# Altium footprint library myPcbLib.PcbLib: 987 footprints (part 1 of 62)
Each footprint in its own frame and in the unit in brackets; x right, y up, seen from the top. Pads: shape width x height; smd on the part's side, far side on the other; paste and mask are expansions set on the pad; w line width, h text height; cw(c..) or ccw(c..) is an arc to the next point about the centre after c.
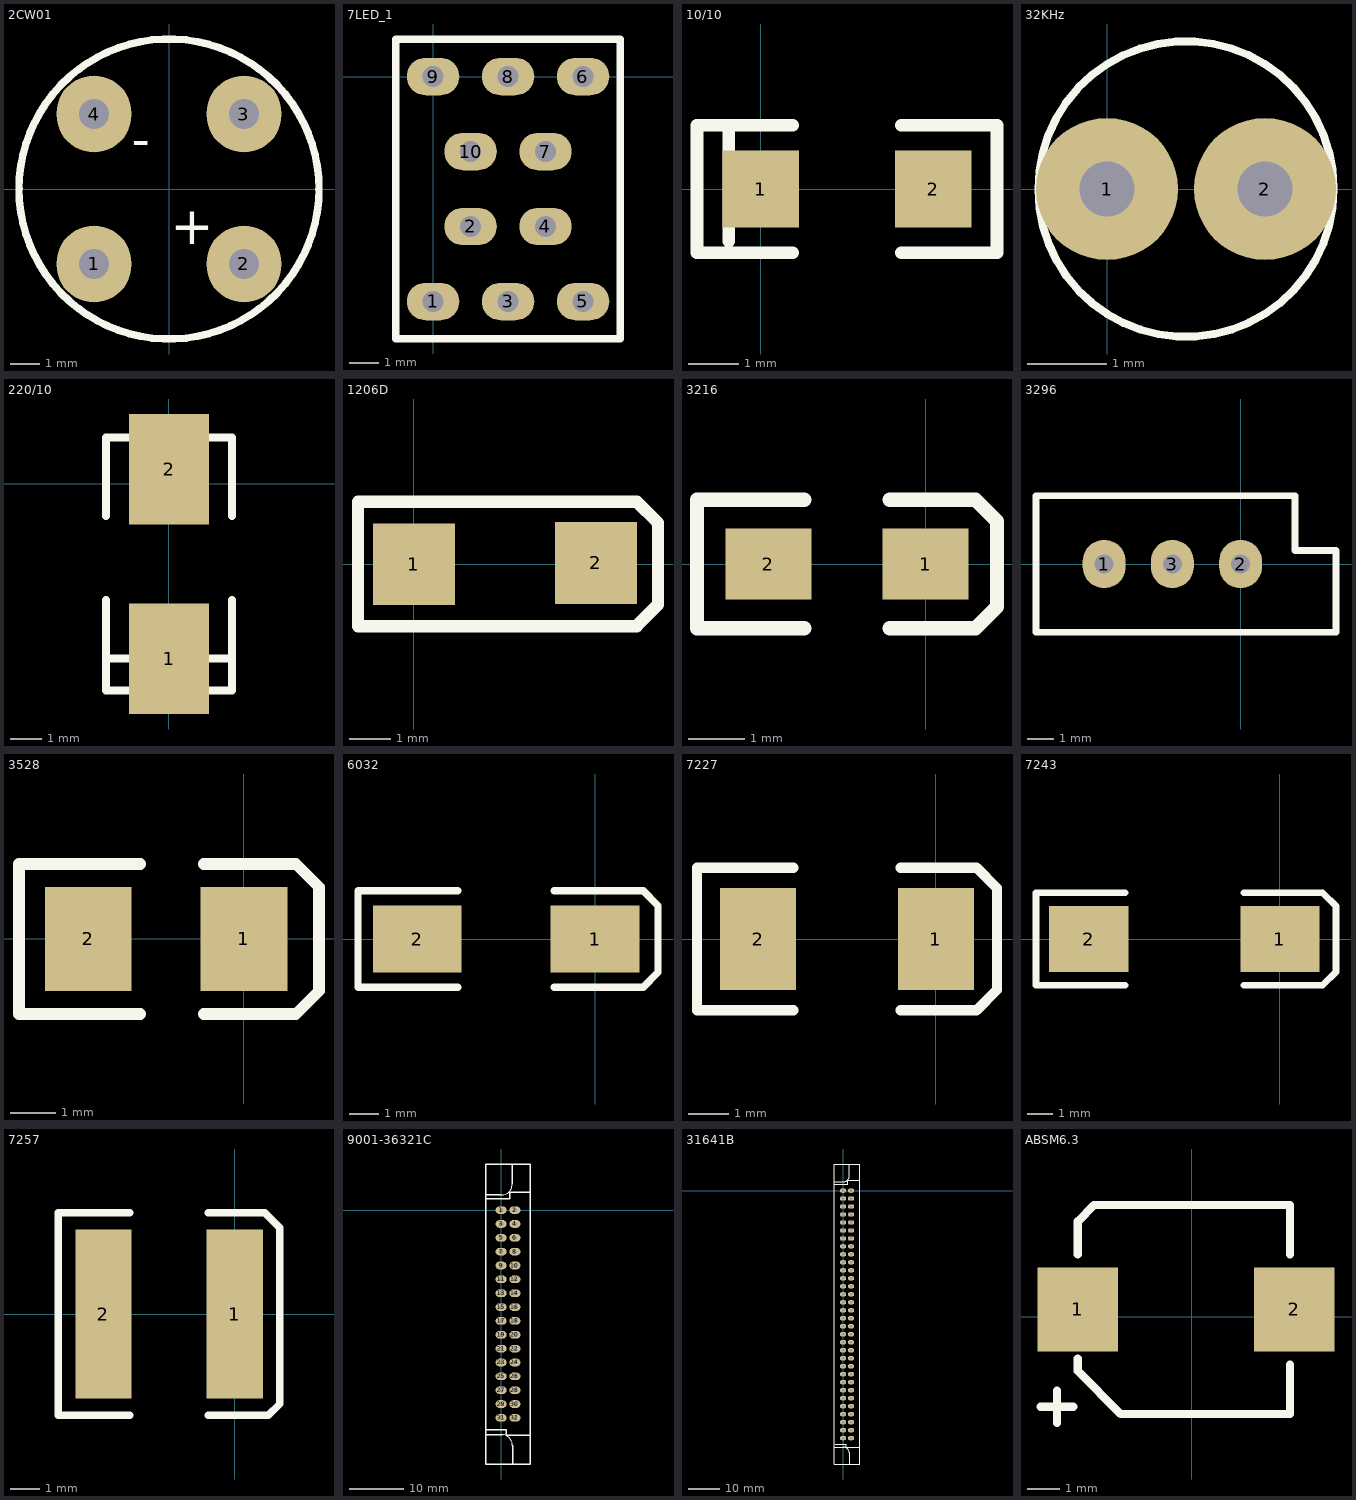
[diagram p0: the footprints below, top view; thin cyan lines are the x and y axes]

## 2CW01 [mm]
pads (4):
  oval 2.54x2.6 hole 1.016: 1(-2.54,-2.54) 2(2.54,-2.54) 3(2.54,2.54) 4(-2.54,2.54)
Top Overlay:
  circle w0.254: c0,0 r5.08
  text "+" at 1.524,-0.762 h1.27
  text "-" at -0.635,2.032 h1.27

## 7LED_1 [mil]
pads (10):
  oval 70x50 hole 28: 1(0,-300) 2(50,-200) 3(100,-300) 4(150,-200) 5(200,-300) 6(200,0) 7(150,-100) 8(100,0) 9(0,0) 10(50,-100)
Top Overlay:
  lines w10: -50,-350 -50,50 250,50 250,-350 -50,-350

## 10/10 [mil]
pads (2):
  rect 60x60 smd: 1(0,0) 2(135,0)
Top Overlay:
  lines w10: -25.2,-40.94 -25.2,47.87 ; 25,-50 -50,-50 -50,50 25,50 ; 110,-50 185,-50 185,50 110,50

## 32KHz [mm]
pads (2):
  round 1.8 hole 0.7: 1(0,0) 2(2,0)
Top Overlay:
  lines w0.1: 2.872,0 cw(c1,0) 2.872,0.01

## 220/10 [mm]
pads (2):
  rect 2.54x3.5 smd: 1(0.012,-5.543) 2(0.012,0.457)
Top Overlay:
  lines w0.254: -1.988,-5.543 2.012,-5.543 ; -1.988,-3.686 -1.988,-6.543 2.012,-6.543 2.012,-3.686 ; -1.988,-1.019 -1.988,1.457 2.012,1.457 2.012,-1.019

## 1206D [mm]
pads (2):
  rect 2x2 smd: 1(0,0) 2(4.445,0.032)
Top Overlay:
  lines w0.305: 5.937,1.037 5.45,1.524 -1.365,1.524 -1.365,-1.513 5.44,-1.513 5.964,-0.99 5.964,1.016

## 3216 [mil]
pads (2):
  rect 60x50 smd: 1(0,0) 2(-110,0)
Top Overlay:
  lines w10: -85,-45 -160,-45 -160,45 -85,45 ; -25,-45 35,-45 50,-30 50,30 35,45 -25,45

## 3296 [mm]
pads (3):
  oval 1.6x1.8 hole 0.711: 1(-5.08,0) 2(0,0) 3(-2.54,0)
Top Overlay:
  lines w0.254: -7.62,-2.54 -7.62,2.54 2.032,2.54 2.032,0.508 3.556,0.508 3.556,-1.524 3.556,-2.032 3.556,-2.54 -7.62,-2.54

## 3528 [mil]
pads (2):
  rect 75x90 smd: 1(0,0) 2(-135,0)
Top Overlay:
  lines w10: -90,-65 -195,-65 -195,65 -90,65 ; -35,-65 45,-65 65,-45 65,45 45,65 -35,65

## 6032 [mil]
pads (2):
  rect 120x90 smd: 1(0,0) 2(-240,0)
Top Overlay:
  lines w10: -185,-65 -320,-65 -320,65 -185,65 ; -55,-65 65,-65 85,-45 85,45 65,65 -55,65

## 7227 [mm]
pads (2):
  rect 1.905x2.54 smd: 1(0,0) 2(-4.445,0)
Top Overlay:
  lines w0.254: -3.556,-1.778 -5.969,-1.778 -5.969,1.778 -3.556,1.778 ; -0.889,-1.778 1.016,-1.778 1.524,-1.27 1.524,1.27 1.016,1.778 -0.889,1.778

## 7243 [mil]
pads (2):
  rect 120x100 smd: 1(0,0) 2(-290,0)
Top Overlay:
  lines w10: -235,-70 -370,-70 -370,70 -235,70 ; -55,-70 65,-70 85,-50 85,50 65,70 -55,70

## 7257 [mm]
pads (2):
  rect 1.905x5.715 smd: 1(0,0) 2(-4.445,0)
Top Overlay:
  lines w0.254: -3.556,-3.429 -5.969,-3.429 -5.969,3.429 -3.556,3.429 ; -0.889,-3.429 1.143,-3.429 1.524,-3.048 1.524,2.921 1.016,3.429 -0.889,3.429

## 9001-36321C [mm]
height 10
pads (32):
  oval 2x1.4 hole 0.8: 1(0,0) 2(2.54,0) 3(0,-2.54) 4(2.54,-2.54) 5(0,-5.08) 6(2.54,-5.08) 7(0,-7.62) 8(2.54,-7.62) 9(0,-10.16) 10(2.54,-10.16) 11(0,-12.7) 12(2.54,-12.7) 13(0,-15.24) 14(2.54,-15.24) 15(0,-17.78) 16(2.54,-17.78) 17(0,-20.32) 18(2.54,-20.32) 19(0,-22.86) 20(2.54,-22.86) 21(0,-25.4) 22(2.54,-25.4) 23(0,-27.94) 24(2.54,-27.94) 25(0,-30.48) 26(2.54,-30.48) 27(0,-33.02) 28(2.54,-33.02) 29(0,-35.56) 30(2.54,-35.56) 31(0,-38.1) 32(2.54,-38.1)
Top Overlay:
  lines w0.102: 0.051,2.769 ccw(c0.051,4.775) 2.057,4.775
  lines w0.127: 0.076,-41.173 cw(c0.076,-43.18) 2.083,-43.18
  lines w0.254: -2.718,-41.148 0.229,-41.148 ; -2.718,-40.259 -2.438,-40.259 ; -2.718,2.769 0.051,2.769 ; -2.667,2.083 1.549,2.083 1.549,3.277 5.32,3.277 ; -2.54,-40.259 0.965,-40.259 0.965,-41.123 ; 0.965,-40.97 0.965,-41.275 5.32,-41.275 ; 2.057,4.851 2.057,8.45 ; 2.108,-46.55 2.108,-43.104 ; -2.78,-46.55 5.32,-46.55 5.32,8.45 -2.78,8.45 -2.78,-46.55

## 31641B [mm]
height 10
pads (64):
  oval 2x1.4 hole 0.8: 1(0,0) 2(2.54,0) 3(0,-2.54) 4(2.54,-2.54) 5(0,-5.08) 6(2.54,-5.08) 7(0,-7.62) 8(2.54,-7.62) 9(0,-10.16) 10(2.54,-10.16) 11(0,-12.7) 12(2.54,-12.7) 13(0,-15.24) 14(2.54,-15.24) 15(0,-17.78) 16(2.54,-17.78) 17(0,-20.32) 18(2.54,-20.32) 19(0,-22.86) 20(2.54,-22.86) 21(0,-25.4) 22(2.54,-25.4) 23(0,-27.94) 24(2.54,-27.94) 25(0,-30.48) 26(2.54,-30.48) 27(0,-33.02) 28(2.54,-33.02) 29(0,-35.56) 30(2.54,-35.56) 31(0,-38.1) 32(2.54,-38.1) 33(0,-40.64) 34(2.54,-40.64) 35(0,-43.18) 36(2.54,-43.18) 37(0,-45.72) 38(2.54,-45.72) 39(0,-48.26) 40(2.54,-48.26) 41(0,-50.8) 42(2.54,-50.8) 43(0,-53.34) 44(2.54,-53.34) 45(0,-55.88) 46(2.54,-55.88) 47(0,-58.42) 48(2.54,-58.42) 49(0,-60.96) 50(2.54,-60.96) 51(0,-63.5) 52(2.54,-63.5) 53(0,-66.04) 54(2.54,-66.04) 55(0,-68.58) 56(2.54,-68.58) 57(0,-71.12) 58(2.54,-71.12) 59(0,-73.66) 60(2.54,-73.66) 61(0,-76.2) 62(2.54,-76.2) 63(0,-78.74) 64(2.54,-78.74)
Top Overlay:
  lines w0.102: 0.051,2.769 ccw(c0.051,4.775) 2.057,4.775
  lines w0.127: 0.062,-81.618 cw(c0.062,-83.625) 2.069,-83.625
  lines w0.254: -2.794,8.45 -2.794,-86.995 5.306,-86.995 5.306,8.45 -2.78,8.45 ; -2.732,-81.593 0.215,-81.593 ; -2.718,2.769 0.051,2.769 ; -2.667,2.083 1.549,2.083 1.549,3.277 5.32,3.277 ; -2.554,-80.704 0.951,-80.704 0.951,-81.568 ; 0.951,-81.72 5.306,-81.72 ; 2.057,4.851 2.057,8.45 ; 2.094,-86.995 2.094,-83.549

## ABSM6.3 [mm]
height 10
pads (2):
  rect 2.5x2.6 smd: 1(-3.543,0.229) 2(3.188,0.229)
Top Overlay:
  lines w0.254: -4.699,-2.794 -4.191,-2.794 ; -4.191,-3.302 -4.191,-2.794 ; -4.191,-2.286 -4.191,-2.794 ; -3.683,-2.794 -4.191,-2.794 ; -3.543,-1.295 -3.543,-1.688 -2.21,-3.021 3.061,-3.021 3.061,-1.486 ; -3.543,1.943 -3.543,2.971 -3.035,3.479 3.061,3.479 3.061,1.943